# Altium footprint library Derogarian_Library.PcbLib: 94 footprints (part 3 of 6)
Each footprint in its own frame and in the unit in brackets; x right, y up, seen from the top. Pads: shape width x height; smd on the part's side, far side on the other; paste and mask are expansions set on the pad; w line width, h text height; cw(c..) or ccw(c..) is an arc to the next point about the centre after c.
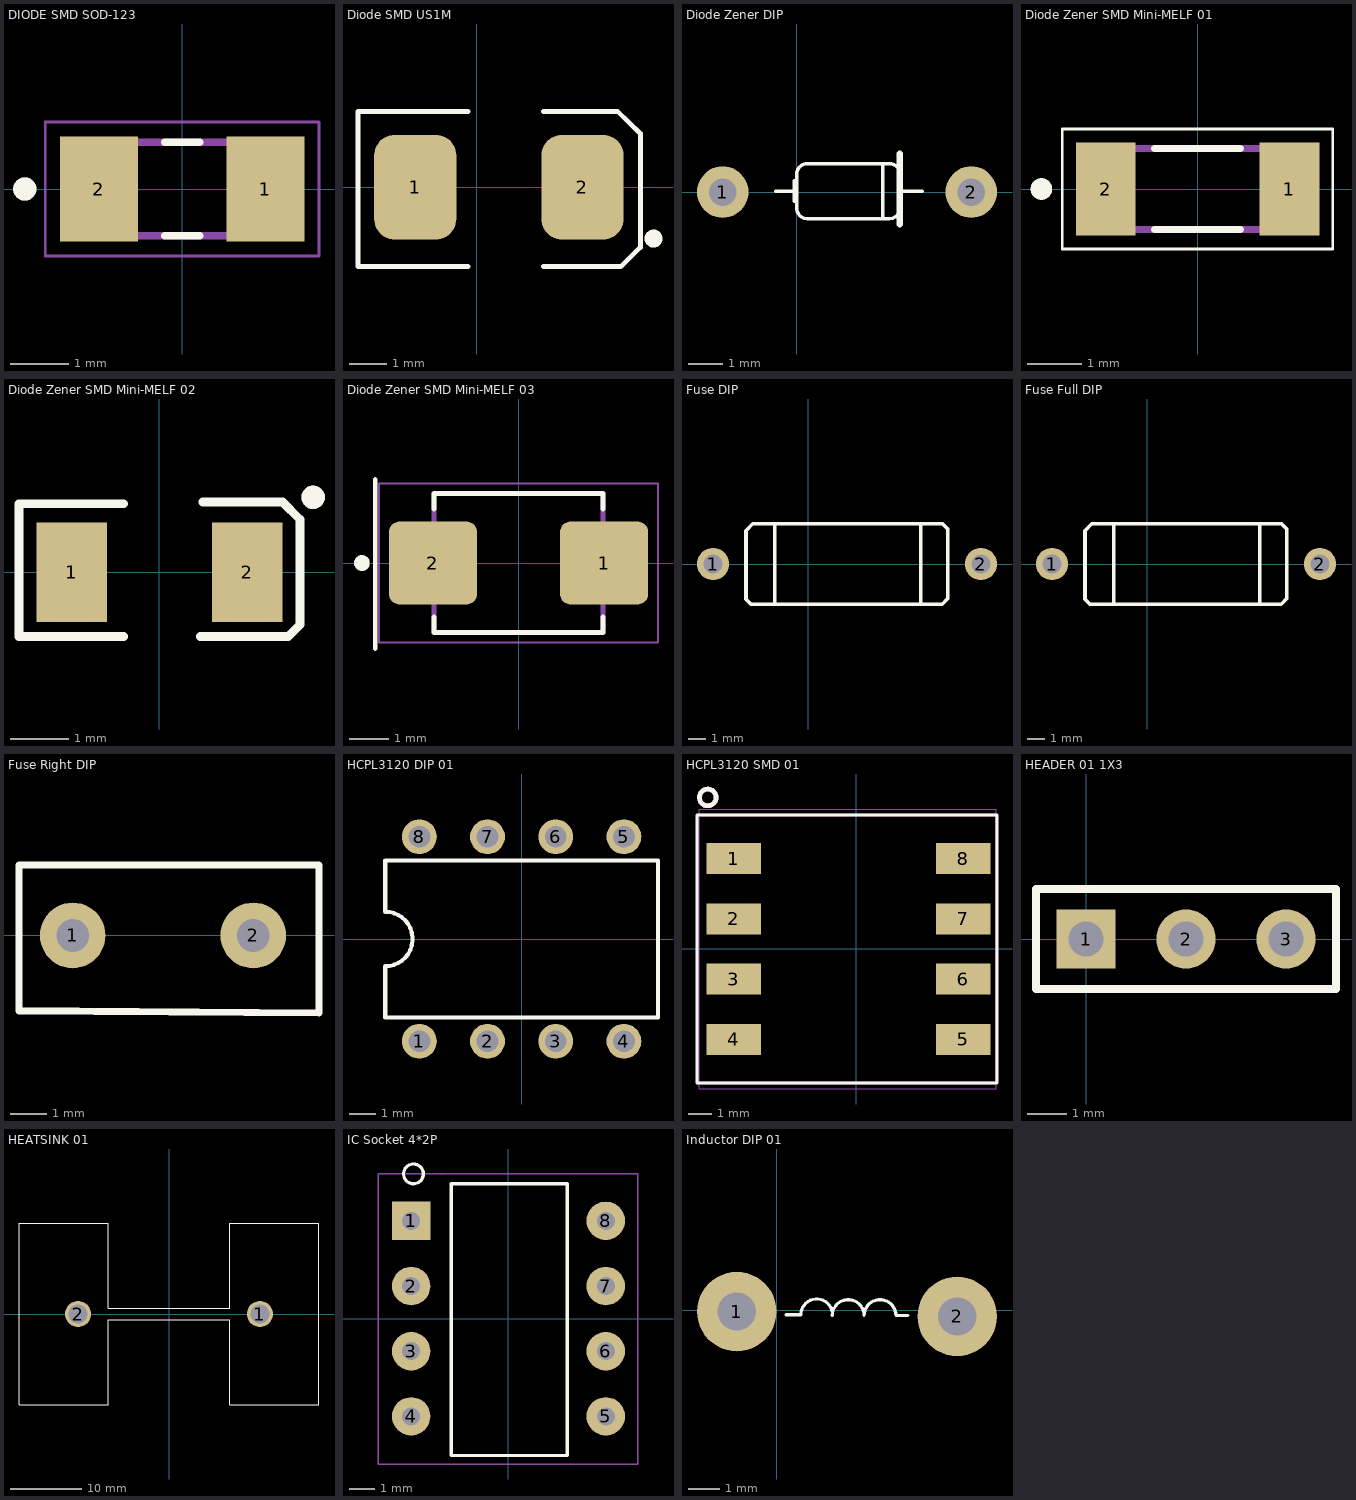
[diagram p2: the footprints below, top view; thin cyan lines are the x and y axes]

## DIODE SMD SOD-123 [mm]
pads (2):
  rect 1.34x1.8 smd: 1(1.43,0) 2(-1.43,0)
Top Overlay:
  circle w0.2: c-2.7,0 r0.1
  lines w0.127: -0.3,-0.8 0.3,-0.8 ; -0.3,0.8 0.3,0.8
Mechanical 13:
  circle w0.2: c-2.7,0 r0.1
  lines w0.127: -1.3,-0.8 -1.3,0.8 1.3,0.8 1.3,-0.8 -1.3,-0.8
Mechanical 15:
  lines w0.05: -2.35,-1.15 -2.35,1.15 2.35,1.15 2.35,-1.15 -2.35,-1.15
3D body "step_temp.STEP": height 1.15, standoff 0, extent -1.8,-0.8 1.8,0.8

## Diode SMD US1M [mm]
pads (2):
  rrect50% 2.2x2.8 smd: 1(-1.645,0) 2(2.825,0)
Top Overlay:
  circle w0.24: c4.725,-1.375 r0.12
  lines w0.127: -0.225,-2.125 -3.175,-2.125 -3.175,2.025 -0.225,2.025 ; 1.775,-2.125 3.845,-2.125 4.375,-1.613 4.375,1.434 3.763,2.025 1.775,2.025
3D body "User Library-403A-03_rotated.STEP": height 2.31, standoff 0, extent -2.095,-1.935 3.345,1.625

## Diode Zener DIP [mm]
pads (2):
  round 1.5 hole 0.8: 1(-2.159,0) 2(5.08,0)
Top Overlay:
  lines w0.1: -0.61,0.025 -0.101,0.025 ; -0.074,-0.275 -0.074,0.325 ; 3.658,0.025 2.999,0.025 ; 2.499,-0.775 2.699,-0.775 ccw(c2.699,-0.475) 2.999,-0.475 2.999,0.025 ; 2.499,-0.775 0.299,-0.775 cw(c0.299,-0.475) -0.001,-0.475 -0.001,0.525 cw(c0.299,0.525) 0.299,0.825 2.499,0.825 ; 2.499,-0.775 2.499,0.825 ; 2.499,0.825 2.699,0.825 cw(c2.699,0.525) 2.999,0.525 2.999,0.025
  lines w0.2: 2.995,-0.94 2.995,1.118
3D body "User Library-Diodo 1N914 (Pitch 280mils).STEP": height 1.84, standoff -2.82, extent -2.464,-0.686 5.264,0.991

## Diode Zener SMD Mini-MELF 01 [mm]
pads (2):
  rect 1.11x1.73 smd: 1(1.705,0) 2(-1.705,0)
Top Overlay:
  circle w0.2: c-2.9,0 r0.1
  lines w0.05: -2.51,-1.115 2.51,-1.115 2.51,1.115 -2.51,1.115 -2.51,-1.115
  lines w0.127: -0.8,-0.75 0.8,-0.75 ; -0.8,0.75 0.8,0.75
Mechanical 13:
  circle w0.2: c-2.9,0 r0.1
  lines w0.127: -1.75,-0.75 -1.75,0.75 1.75,0.75 1.75,-0.75 -1.75,-0.75
3D body "BZT55B22 L0G.STEP": height 1.6, standoff 0, extent -1.64,-0.83 1.86,0.77

## Diode Zener SMD Mini-MELF 02 [mm]
pads (2):
  rect 1.2x1.7 smd: 1(-1.5,0) 2(1.5,0)
Top Overlay:
  circle w0.2: c2.625,1.278 r0.1
  lines w0.15: -0.611,-1.1 -2.4,-1.1 -2.4,1.17 -0.611,1.17 ; 0.7,-1.1 2.2,-1.1 2.4,-0.9 2.4,-0.5 2.4,0.9 2.1,1.2 0.74,1.2
Mechanical 13:
  circle w0.2: c2.625,1.278 r0.1
3D body "User Library-MiniMelf-2.STEP": height 1.6, standoff 0, extent -1.71,-0.81 1.99,0.79

## Diode Zener SMD Mini-MELF 03 [mm]
pads (2):
  rrect25% 2.25x2.12 smd: 1(2.185,0) 2(-2.185,0)
Top Overlay:
  circle w0.2: c-4,0 r0.1
  lines w0.127: -3.66,-2.185 -3.66,2.135 ; -2.16,-1.374 -2.16,-1.78 2.16,-1.78 2.16,-1.374 ; -2.16,1.374 -2.16,1.78 2.16,1.78 2.16,1.374
Mechanical 13:
  lines w0.127: -2.16,-1.78 -2.16,1.78 2.16,1.78 2.16,-1.78 -2.16,-1.78
Mechanical 15:
  lines w0.05: -3.56,-2.03 3.56,-2.03 3.56,2.03 -3.56,2.03 -3.56,-2.03
3D body "step_temp.STEP": height 2.49, standoff 0.02, extent -2.72,-1.78 2.72,1.78

## Fuse DIP [mm]
pads (2):
  round 1.8 hole 1.05: 1(-5.334,0) 2(9.65,0)
Top Overlay:
  lines w0.2: -2.17,-2.25 -3.211,-2.25 -3.494,-1.967 -3.494,-0.152 -3.494,1.865 -3.109,2.25 -2.159,2.25 6.488,2.25 7.504,2.25 7.783,1.97 7.783,0.051 7.783,-1.945 7.478,-2.25 6.477,-2.25 -2.159,-2.25 ; -1.891,-2.25 -1.891,0 -1.891,2.25 ; 6.285,-2.25 6.285,0 6.285,2.25
3D body "User Library-T5A-250V.STEP": height 3.35, standoff -2.41, extent -5.641,-1.651 9.959,1.649

## Fuse Full DIP [mm]
pads (2):
  round 1.8 hole 1.05: 1(-5.334,0) 2(9.65,0)
Top Overlay:
  lines w0.2: -2.17,-2.25 -3.211,-2.25 -3.494,-1.967 -3.494,-0.152 -3.494,1.865 -3.109,2.25 -2.159,2.25 6.488,2.25 7.504,2.25 7.783,1.97 7.783,0.051 7.783,-1.945 7.478,-2.25 6.477,-2.25 -2.159,-2.25 ; -1.891,-2.25 -1.891,0 -1.891,2.25 ; 6.285,-2.25 6.285,0 6.285,2.25
3D body "User Library-Full Fuse 5x20.STEP": height 9.5, standoff -3.95, extent -7.053,-2.87 13.047,3.039

## Fuse Right DIP [mm]
pads (2):
  round 1.8 hole 0.9: 1(3.277,0) 2(8.23,0)
Top Overlay:
  lines w0.2: 1.803,-2.066 1.803,1.93 10.033,1.93 10.033,-2.126 1.803,-2.066
3D body "User Library-Fuse 3_6x10.STEP": height 13.7, standoff -2, extent 2.954,-2.122 10.254,1.778

## HCPL3120 DIP 01 [mm]
pads (8):
  round 1.3 hole 0.813: 1(-3.81,-3.81) 2(-1.27,-3.81) 3(1.27,-3.81) 4(3.81,-3.81) 5(3.81,3.81) 6(1.27,3.81) 7(-1.27,3.81) 8(-3.81,3.81)
Top Overlay:
  lines w0.152: -5.08,-2.921 -5.08,-1.016 ccw(c-5.08,0) -5.08,1.016 -5.08,2.921 5.08,2.921 5.08,-2.921 -5.08,-2.921
3D body "HCPL-3120#060.STEP": height 4.96, standoff -2.95, extent -4.86,-3.81 4.91,3.81

## HCPL3120 SMD 01 [mm]
pads (8):
  rect 2.29x1.3 smd: 1(-5.156,3.81) 2(-5.156,1.27) 3(-5.156,-1.27) 4(-5.156,-3.81) 5(4.521,-3.81) 6(4.521,-1.27) 7(4.521,1.27) 8(4.521,3.81)
Top Overlay:
  circle w0.2: c-6.252,6.389 r0.352
  lines w0.127: -6.706,5.639 -6.706,3.519 -6.706,-5.65 5.944,-5.65 5.944,5.65 -4.575,5.65 -6.173,5.65 -6.694,5.65
Mechanical 13:
  circle w0.2: c-6.252,6.389 r0.352
  lines w0.127: -6.68,-5.65 -6.68,5.65 5.918,5.65 5.918,-5.65 -6.68,-5.65
Mechanical 15:
  lines w0.05: -6.604,-5.9 -6.604,5.9 5.918,5.9 5.918,-5.9 -6.604,-5.9
3D body "HCPL3120.STEP": height 4.45, standoff 0, extent -4.901,-4.749 4.749,4.901

## HEADER 01 1X3 [mm]
pads (3):
  rect 1.5x1.5 hole 0.9: 1(0,0)
  round 1.5 hole 0.9: 2(2.54,0) 3(5.08,0)
Top Overlay:
  lines w0.2: -1.27,-1.27 6.35,-1.27 6.35,1.27 -1.27,1.27 -1.27,-1.27
3D body "User Library-SMW250-03.STEP": height 7, standoff -3.5, extent -2.37,-3.489 7.53,2.9

## HEATSINK 01 [mil]
pads (2):
  round 143 hole 103: 1(500,0) 2(-500,0)
Top Overlay:
  lines w5: -825,-500 -335,-500 -335,-31 335,-31 335,-500 825,-500 825,500 335,500 335,31 -335,31 -335,500 -825,500 -825,-500
3D body "step_temp.STEP": height 2500, standoff -155.91, extent -825,-500 825,500

## Hole 01 [mm]

## IC Socket 4*2P [mm]
pads (8):
  rect 1.5x1.5 hole 0.7: 1(-3.793,3.81)
  round 1.5 hole 0.7: 2(-3.793,1.27) 3(-3.793,-1.27) 4(-3.793,-3.81) 5(3.793,-3.81) 6(3.793,-1.27) 7(3.793,1.27) 8(3.793,3.81)
Top Overlay:
  circle w0.127: c-3.7,5.639 r0.386
  lines w0.127: 2.269,-5.334 -2.227,-5.334 -2.227,5.258 2.294,5.258 2.294,-5.334
Mechanical 15:
  lines w0.05: -2.674,5.623 -2.659,5.639 ; -5.072,-5.664 5.037,-5.664 5.037,5.639 -5.072,5.639 -5.072,-5.664
3D body "a_08-lc-tt.stp": height 6, standoff -2.25, extent -5.004,-5.105 5.156,5.055

## Inductor DIP 01 [mm]
height 2.54
pads (2):
  round 2.5 hole 1.2: 1(-1.25,-0.05) 2(5.675,-0.2)
Top Overlay:
  lines w0.1: 0.3,-0.15 0.75,-0.15 ; 0.761,-0.152 cw(c1.261,-0.152) 1.761,-0.152 ; 1.75,-0.175 cw(c2.25,-0.175) 2.75,-0.175 cw(c3.25,-0.175) 3.75,-0.175 4.125,-0.175
3D body "7447016.stp": height 18.82, standoff -12.8, extent -1.895,-8.869 6.645,8.518